# Altium footprint library PCB_IntegratedCircuit.PcbLib: 82 footprints (part 4 of 6)
Each footprint in its own frame and in the unit in brackets; x right, y up, seen from the top. Pads: shape width x height; smd on the part's side, far side on the other; paste and mask are expansions set on the pad; w line width, h text height; cw(c..) or ccw(c..) is an arc to the next point about the centre after c.
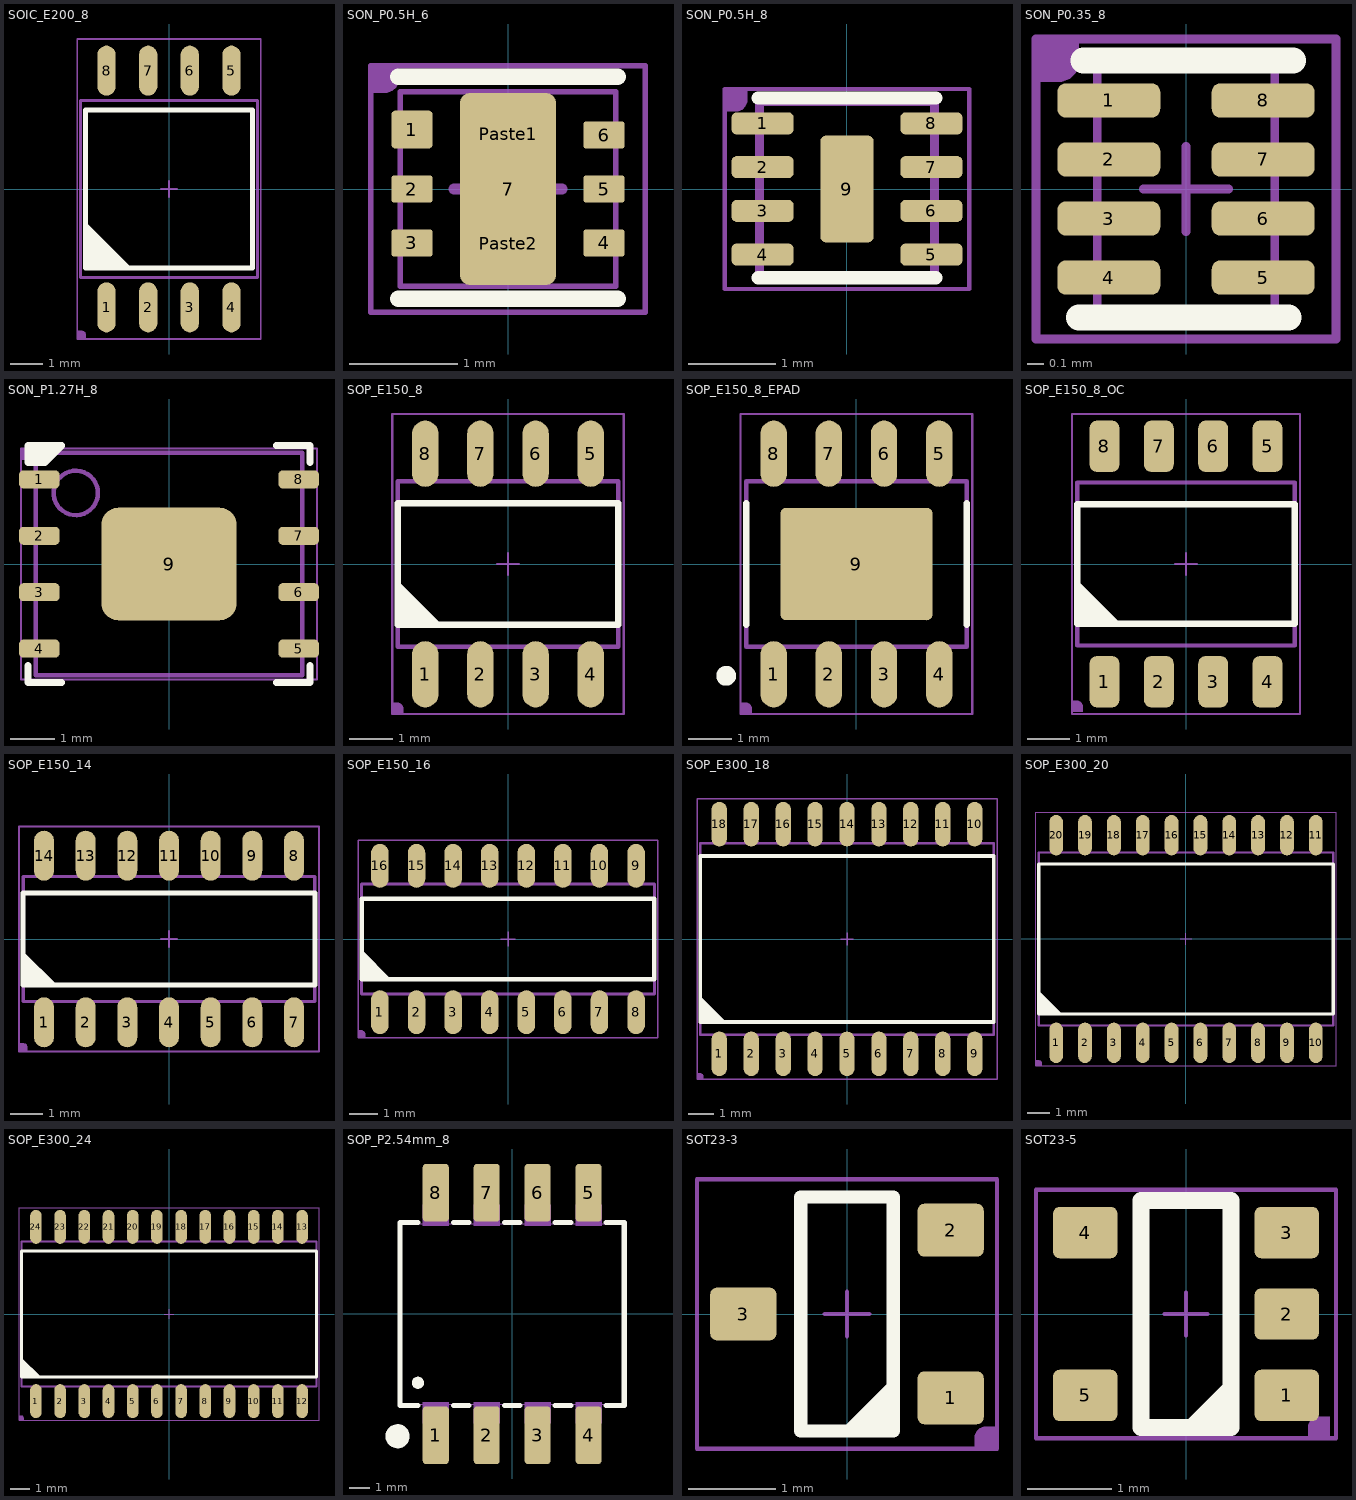
[diagram p3: the footprints below, top view; thin cyan lines are the x and y axes]

## SOIC_E200_8 [mil]
height 85.04
pads (8):
  oval 22x60 smd: 1(-75,-142) 2(-25,-142) 3(25,-142) 4(75,-142) 5(75,142) 6(25,142) 7(-25,142) 8(-75,142)
Top Overlay:
  region: -100,-95 -100,-40 -45,-95
  lines w6: -100,-95 -100,95 100,95 100,-95 -100,-95
Mechanical 13:
  lines w2: -10,0 10,0 ; 0,-10 0,10
  lines w4: -106.3,-106.3 -106.3,106.3 106.3,106.3 106.3,-106.3 -106.3,-106.3
T-Component:
  region: -110,-180 -110,-170 -105,-170 -104.01,-170 -102.17,-170.76 -100.76,-172.17 -100,-174.01 -100,-175 -100,-180
  lines w2: -110,-180 -110,180 110,180 110,-180 -110,-180
3D body "User Library-SOIC-8-208.STEP": height 84.37, standoff -0.28, extent -106.3,-161.42 106.29,161.42

## SON_P0.5H_6 [mil]
height 39.37
pads (9):
  rrect20% 15x13.78 smd: 1(-35,21.65)
  rrect20% 15x10 smd: 2(-35,0) 3(-35,-19.69) 4(35,-19.69) 5(35,0) 6(35,19.68)
  rrect20% 35x70 smd paste-100: 7(0,0)
  rrect20% 30x15 on Top Paste mask+1.97: Paste1(0,20) Paste2(0,-20)
Top Overlay:
  lines w6: -40,-40 40,-40 ; -40,41 40,41
Top Solder:
  region: -43,19.69 -43,-19.68 -27,-19.68 -27,19.69
  region: 27,19.69 27,-19.68 43,-19.68 43,19.69
Mechanical 13:
  lines w2: -39.37,-35.43 -39.37,35.43 39.37,35.43 39.37,-35.43 -39.37,-35.43
T-Component:
  region: -50,45 -40,45 -40,40 -40,39.01 -40.76,37.17 -42.17,35.76 -44.01,35 -45,35 -50,35
  lines w1.97: -50,-45 -50,45 50,45 50,-45 -50,-45
B-Component:
  lines w3.94: -19.68,0 19.69,0 ; 0,-19.69 0,19.68
3D body "PSON50P200X100_HS-7N.step": height 39.37, standoff -0.04, extent -39.41,-35.43 39.41,35.43

## SON_P0.5H_8 [mil] "SON, 8-Leads, Body 2.00x2.00mm, Pitch"
height 35.43
pads (9):
  rrect50% 28x10 smd mask+2: 1(-38,29.53) 2(-38,9.84) 3(-38,-9.84) 4(-38,-29.53) 5(38,-29.53) 6(38,-9.84) 7(38,9.84) 8(38,29.53)
  rrect20% 24x48 smd mask+2: 9(0,0)
Top Overlay:
  lines w6: -40,-40 40,-40 ; -40,41 40,41
Top Solder:
  region: 52,-29.53 52,29.53 24,29.53 24,-29.53
  region: -52,29.53 -52,-29.53 -24,-29.53 -24,29.53
Mechanical 13:
  lines w2: -10,0 10,0 ; 0,-10 0,10
  lines w3.94: -39.37,-39.37 39.37,-39.37 39.37,39.37 -39.37,39.37 -39.37,-39.37
T-Component:
  region: -55,45 -45,45 -45,40 -45,39.01 -45.76,37.17 -47.17,35.76 -49.01,35 -50,35 -55,35
  lines w1.97: -55,-45 -55,45 55,45 55,-45 -55,-45
3D body "SON50P200X90_HS-9L.step": height 35.43, standoff -0.04, extent -39.41,-39.37 39.41,39.37

## SON_P0.35_8 [mil] "SON, 8-Leads, Body 1.40x1.00mm, Pitch 0.35mm, IPC High Density"
height 15.75
pads (8):
  rrect50% 24x8 smd: 1(-18,20.67) 2(-18,6.89) 3(-18,-6.89) 4(-18,-20.67) 5(18,-20.67) 6(18,-6.89) 7(18,6.89) 8(18,20.67)
Top Overlay:
  lines w6: -25,-30 24,-30 ; -24,30 25,30
Top Solder:
  region: 6,20.67 30,20.67 30,-20.67 6,-20.67
  region: -30,20.67 -6,20.67 -6,-20.67 -30,-20.67
Mechanical 13:
  lines w2: -10,0 10,0 ; 0,-10 0,10 ; -20.67,-28.54 20.67,-28.54 20.67,28.54 -20.67,28.54 -20.67,-28.54
T-Component:
  region: -35,35 -25,35 -25,30 -25,29.01 -25.76,27.17 -27.17,25.76 -29.01,25 -30,25 -35,25
  lines w2: -35,-35 -35,35 35,35 35,-35 -35,-35
3D body "SON35P100X40-8L.step": height 15.75, standoff 0, extent -22.64,-28.54 22.64,28.54

## SON_P1.27H_8 [mil] "SON, 8-Leads, Body 5.00x6.00mm, Pitch 1.27mm, Thermal Pad 3.40x4.30mm, IPC High Density"
height 29.53
pads (9):
  rrect50% 36x16 smd: 1(-115,75) 2(-115,25) 3(-115,-25) 4(-115,-75) 5(115,-75) 6(115,-25) 7(115,25) 8(115,75)
  rrect30% 120x100 smd paste-84.65: 9(0,0)
Top Overlay:
  region: -125,105 -95,105 -110,90 -125,90
  lines w6: -125,-90 -125,-105 -95,-105 ; 95,-105 125,-105 125,-90 ; 95,105 125,105 125,90 ; -125,90 -125,105 -95,105 -110,90 -125,90
Top Paste:
  rectangle: -24.21,-18.31 24.21,18.31
Mechanical 13:
  circle w3.94: c-82.68,62.99 r19.68
  lines w4: -19.68,0 19.69,0 ; 0,-19.68 0,19.68 ; -118.11,-98.43 -118.11,98.43 118.11,98.43 118.11,-98.43 -118.11,-98.43
T-Component:
  region: -131.3,102.36 -121.3,102.36 -121.3,97.36 -121.3,96.37 -122.06,94.53 -123.47,93.12 -125.3,92.36 -126.3,92.36 -131.3,92.36
  lines w2: -131.3,-102.36 -131.3,102.36 131.3,102.36 131.3,-102.36 -131.3,-102.36
3D body "SON127P600X75_HS-9L.step": height 29.53, standoff 0, extent -118.9,-98.43 118.9,98.43

## SOP_E150_8 [mil]
height 68.9
pads (8):
  oval 24x60 smd mask+2: 1(-75,-100) 2(-25,-100) 3(25,-100) 4(75,-100) 5(75,100) 6(25,100) 7(-25,100) 8(-75,100)
Top Overlay:
  region: -100,-55 -100,-15 -60,-55
  lines w6: -100,-55 100,-55 100,55 -100,55 -100,-55
Mechanical 13:
  lines w2: -10,0 10,0 ; 0,-10 0,10
  lines w4: -100,-75 -100,75 100,75 100,-75 -100,-75
T-Component:
  region: -105,-136 -105,-126 -100,-126 -99.01,-126 -97.17,-126.76 -95.76,-128.17 -95,-130.01 -95,-131 -95,-136
  lines w2: -105,-136 105,-136 105,136 -105,136 -105,-136
3D body "User Library-SOIC-8-1.STEP": height 68.9, standoff 0, extent -96.46,-118.1 96.46,118.12

## SOP_E150_8_EPAD [mil]
pads (9):
  oval 24x60 smd mask+2: 1(-75,-100) 2(-25,-100) 3(25,-100) 4(75,-100) 5(75,100) 6(25,100) 7(-25,100) 8(-75,100)
  rrect10% 138x102 smd paste-68.5 mask+0: 9(0,0)
Top Overlay:
  circle w10: c-118.11,-101.38 r4
  lines w6: -100,-55 -100,55 ; 100,-55 100,55
Mechanical 13:
  lines w2: -10,0 10,0 ; 0,-10 0,10
  lines w4: -100,-75 100,-75 100,75 -100,75 -100,-75
T-Component:
  region: -105,-136 -105,-126 -100,-126 -99.01,-126 -97.17,-126.76 -95.76,-128.17 -95,-130.01 -95,-131 -95,-136
  lines w2: -105,-136 -105,136 105,136 105,-136 -105,-136
3D body "User Library-SOIC-8-1.STEP": height 68.9, standoff 0, extent -96.46,-118.1 96.46,118.12

## SOP_E150_8_OC [mm]
pads (8):
  rrect50% 0.7x1.2 smd mask+0.051: 1(-1.905,-2.75) 2(-0.635,-2.75) 3(0.635,-2.75) 4(1.905,-2.75) 5(1.905,2.75) 6(0.635,2.75) 7(-0.635,2.75) 8(-1.905,2.75)
Top Overlay:
  region: -2.54,-1.397 -2.54,-0.381 -1.524,-1.397
  lines w0.152: -2.54,-1.397 -2.54,1.397 2.54,1.397 2.54,-1.397 -2.54,-1.397
Mechanical 13:
  lines w0.051: -0.254,0 0.254,0 ; 0,-0.254 0,0.254
  lines w0.102: -2.54,-1.905 2.54,-1.905 2.54,1.905 -2.54,1.905 -2.54,-1.905
T-Component:
  region: -2.667,-3.454 -2.667,-3.2 -2.54,-3.2 -2.515,-3.2 -2.468,-3.22 -2.432,-3.255 -2.413,-3.302 -2.413,-3.327 -2.413,-3.454
  lines w0.051: -2.667,-3.505 -2.667,3.505 2.667,3.505 2.667,-3.505 -2.667,-3.505
3D body "SO8.step": height 2.6, standoff 0, extent -2.55,-3 2.55,3

## SOP_E150_14 [mil]
height 68.9
pads (14):
  oval 24x60 smd: 1(-150,-100) 2(-100,-100) 3(-50,-100) 4(0,-100) 5(50,-100) 6(100,-100) 7(150,-100) 8(150,100) 9(100,100) 10(50,100) 11(0,100) 12(-50,100) 13(-100,100) 14(-150,100)
Top Overlay:
  region: -175,-55 -175,-15 -135,-55
  lines w6: -175,-55 175,-55 175,55 -175,55 -175,-55
Mechanical 13:
  lines w2: -10,0 10,0 ; 0,-10 0,10
  lines w4: -175,-75 175,-75 175,75 -175,75 -175,-75
T-Component:
  region: -180,-135 -180,-125 -175,-125 -174.01,-125 -172.17,-125.76 -170.76,-127.17 -170,-129.01 -170,-130 -170,-135
  lines w2: -180,-135 180,-135 180,135 -180,135 -180,-135
3D body "User Library-SOIC-14.STEP": height 68.9, standoff 0, extent -172.25,-118.1 172.24,118.11

## SOP_E150_16 [mil]
height 68.9
pads (16):
  oval 24x60 smd: 1(-175,-100) 2(-125,-100) 3(-75,-100) 4(-25,-100) 5(25,-100) 6(75,-100) 7(125,-100) 8(175,-100) 9(175,100) 10(125,100) 11(75,100) 12(25,100) 13(-25,100) 14(-75,100) 15(-125,100) 16(-175,100)
Top Overlay:
  region: -200,-55 -200,-15 -160,-55
  lines w6: -200,-55 -200,55 200,55 200,-55 -200,-55
Mechanical 13:
  lines w2: -10,0 10,0 ; 0,-10 0,10
  lines w4: -200,-75 200,-75 200,75 -200,75 -200,-75
T-Component:
  region: -205,-135 -205,-125 -200,-125 -199.01,-125 -197.17,-125.76 -195.76,-127.17 -195,-129.01 -195,-130 -195,-135
  lines w2: -205,-135 205,-135 205,135 -205,135 -205,-135
3D body "User Library-SOIC-16-2.STEP": height 68.9, standoff 0, extent -196.85,-118.1 196.85,118.11

## SOP_E300_18 [mil]
height 104.33
pads (18):
  oval 24x70 smd: 1(-200,-180) 2(-150,-180) 3(-100,-180) 4(-50,-180) 5(0,-180) 6(50,-180) 7(100,-180) 8(150,-180) 9(200,-180) 10(200,180) 11(150,180) 12(100,180) 13(50,180) 14(0,180) 15(-50,180) 16(-100,180) 17(-150,180) 18(-200,180)
Top Overlay:
  region: -230,-130 -230,-90 -190,-130
  lines w6: -230,-130 230,-130 230,130 -230,130 -230,-130
Mechanical 13:
  lines w2: -10,0 10,0 ; 0,-10 0,10
  lines w4: -230,-150 230,-150 230,150 -230,150 -230,-150
T-Component:
  region: -235,-220 -235,-210 -230,-210 -229.01,-210 -227.17,-210.76 -225.76,-212.17 -225,-214.01 -225,-215 -225,-220
  lines w2: -235,-220 235,-220 235,220 -235,220 -235,-220
3D body "User Library-SOIC-18-300.STEP": height 101.26, standoff -1.1, extent -231.31,-208.66 231.29,208.66

## SOP_E300_20 [mil]
height 104.33
pads (20):
  oval 24x70 smd: 1(-225,-180) 2(-175,-180) 3(-125,-180) 4(-75,-180) 5(-25,-180) 6(25,-180) 7(75,-180) 8(125,-180) 9(175,-180) 10(225,-180) 11(225,180) 12(175,180) 13(125,180) 14(75,180) 15(25,180) 16(-25,180) 17(-75,180) 18(-125,180) 19(-175,180) 20(-225,180)
Top Overlay:
  region: -255,-130 -255,-90 -215,-130
  lines w6: -255,-130 255,-130 255,130 -255,130 -255,-130
Mechanical 13:
  lines w2: -10,0 10,0 ; 0,-10 0,10
  lines w4: -255,-150 255,-150 255,150 -255,150 -255,-150
T-Component:
  region: -260,-220 -260,-210 -255,-210 -254.01,-210 -252.17,-210.76 -250.76,-212.17 -250,-214.01 -250,-215 -250,-220
  lines w2: -260,-220 -260,220 260,220 260,-220 -260,-220
3D body "User Library-SOIC-20-300.STEP": height 101.26, standoff -1.1, extent -255.91,-208.66 255.9,208.66

## SOP_E300_24 [mil]
height 104.33
pads (24):
  oval 24x70 smd: 1(-275,-180) 2(-225,-180) 3(-175,-180) 4(-125,-180) 5(-75,-180) 6(-25,-180) 7(25,-180) 8(75,-180) 9(125,-180) 10(175,-180) 11(225,-180) 12(275,-180) 13(275,180) 14(225,180) 15(175,180) 16(125,180) 17(75,180) 18(25,180) 19(-25,180) 20(-75,180) 21(-125,180) 22(-175,180) 23(-225,180) 24(-275,180)
Top Overlay:
  region: -305,-130 -305,-90 -265,-130
  lines w6: -305,-130 305,-130 305,130 -305,130 -305,-130
Mechanical 13:
  lines w2: -10,0 10,0 ; 0,-10 0,10
  lines w4: -305,-150 305,-150 305,150 -305,150 -305,-150
T-Component:
  region: -310,-220 -310,-210 -305,-210 -304.01,-210 -302.17,-210.76 -300.76,-212.17 -300,-214.01 -300,-215 -300,-220
  lines w2: -310,-220 -310,220 310,220 310,-220 -310,-220
3D body "User Library-SOIC_24.STEP": height 102.36, standoff 0, extent -297.84,-204.72 308.46,204.73

## SOP_P2.54mm_8 [mm]
pads (8):
  rrect25% 1.3x2.87 smd: 1(-3.81,-6.045) 2(-1.27,-6.045) 3(1.27,-6.045) 4(3.81,-6.045) 5(3.81,6.045) 6(1.27,6.045) 7(-1.27,6.045) 8(-3.81,6.045)
Top Overlay:
  circle w0.3: c-4.699,-3.429 r0.15
  circle w0.6: c-5.715,-6.096 r0.3
  lines w0.254: -4.689,4.572 -5.588,4.572 -5.588,4.445 -5.588,-4.572 -4.688,-4.572 ; -2.932,-4.572 -2.148,-4.572 ; -2.932,4.572 -2.148,4.572 ; -0.392,-4.572 0.392,-4.572 ; -0.392,4.572 0.392,4.572 ; 2.148,-4.572 2.932,-4.572 ; 2.148,4.572 2.932,4.572 ; 4.688,-4.572 5.588,-4.572 5.588,4.572 4.688,4.572
Mechanical 6:
  circle w0.6: c-3.81,-6.858 r0.3
B-Component:
  region: -5.54,-6.15 -5.54,-6.125 -5.575,-6.09 -5.625,-6.09 -5.66,-6.125 -5.66,-6.15 -5.66,-6.175 -5.625,-6.21 -5.575,-6.21 -5.54,-6.175
  region: 0.62,-5.46 0.62,-4.4 1.92,-4.4 1.92,-5.46
  region: 1.015,-6.15 1.015,-5.45 1.525,-5.45 1.525,-6.15
  region: 3.555,-6.15 3.555,-5.45 4.065,-5.45 4.065,-6.15
  region: 3.16,-5.46 3.16,-4.4 4.46,-4.4 4.46,-5.46
  region: -1.525,-6.15 -1.525,-5.45 -1.015,-5.45 -1.015,-6.15
  region: -1.92,-5.46 -1.92,-4.4 -0.62,-4.4 -0.62,-5.46
  region: -4.065,-6.15 -4.065,-5.45 -3.555,-5.45 -3.555,-6.15
  region: -4.46,-5.46 -4.46,-4.4 -3.16,-4.4 -3.16,-5.46
  region: 4.065,6.15 4.065,5.45 3.555,5.45 3.555,6.15
  region: 4.46,5.46 4.46,4.4 3.16,4.4 3.16,5.46
  region: 1.92,5.46 1.92,4.4 0.62,4.4 0.62,5.46
  region: 1.525,6.15 1.525,5.45 1.015,5.45 1.015,6.15
  region: -0.62,5.46 -0.62,4.4 -1.92,4.4 -1.92,5.46
  region: -1.015,6.15 -1.015,5.45 -1.525,5.45 -1.525,6.15
  region: -3.16,5.46 -3.16,4.4 -4.46,4.4 -4.46,5.46
  region: -3.555,6.15 -3.555,5.45 -4.065,5.45 -4.065,6.15
  lines w0.051: -5.6,-4.5 -5.6,4.5 5.6,4.5 5.6,-4.5 -5.6,-4.5
3D body "Unnamed-PCBModelU1.step": height 4.75, standoff 0, extent -5.6,-6.15 5.6,6.15

## SOT23-3 [mil]
height 39.5
pads (3):
  rrect25% 30x24 smd mask+2: 1(47,-38) 2(47,38) 3(-47,0)
Top Overlay:
  region: 21,-53 -3,-53 21,-29
  lines w6: -21,-53 -21,53 21,53 21,-53 -21,-53
Mechanical 13:
  lines w2: -10,0 10,0 ; 0,-10 0,10
T-Component:
  region: 68,-61 58,-61 58,-56 58,-55.01 58.76,-53.17 60.17,-51.76 62.01,-51 63,-51 68,-51
  lines w2: -68,-61 68,-61 68,61 -68,61 -68,-61
3D body "User Library-SOT23-3.STEP": height 51.18, standoff 0, extent -55.12,-57.09 55.11,57.09

## SOT23-5 [mil]
height 62.99
pads (5):
  rrect25% 30x24 smd: 1(47,-38) 2(47,0) 3(47,38) 4(-47,38) 5(-47,-38)
Top Overlay:
  region: 21,-53 -3,-53 21,-29
  lines w8: -21,-53 -21,53 21,53 21,-53 -21,-53
Mechanical 13:
  lines w2: -10,0 10,0 ; 0,-10 0,10
T-Component:
  region: 67,-58 57,-58 57,-53 57,-52.01 57.76,-50.17 59.17,-48.76 61.01,-48 62,-48 67,-48
  lines w2: -70,-58 70,-58 70,58 -70,58 -70,-58
3D body "User Library-SOT23-5-2.STEP": height 57.09, standoff 0, extent -55.12,-57.09 55.11,57.09